# Altium footprint library Package_QFP.PcbLib: 84 footprints (part 4 of 6)
Each footprint in its own frame and in the unit in brackets; x right, y up, seen from the top. Pads: shape width x height; smd on the part's side, far side on the other; paste and mask are expansions set on the pad; w line width, h text height; cw(c..) or ccw(c..) is an arc to the next point about the centre after c.
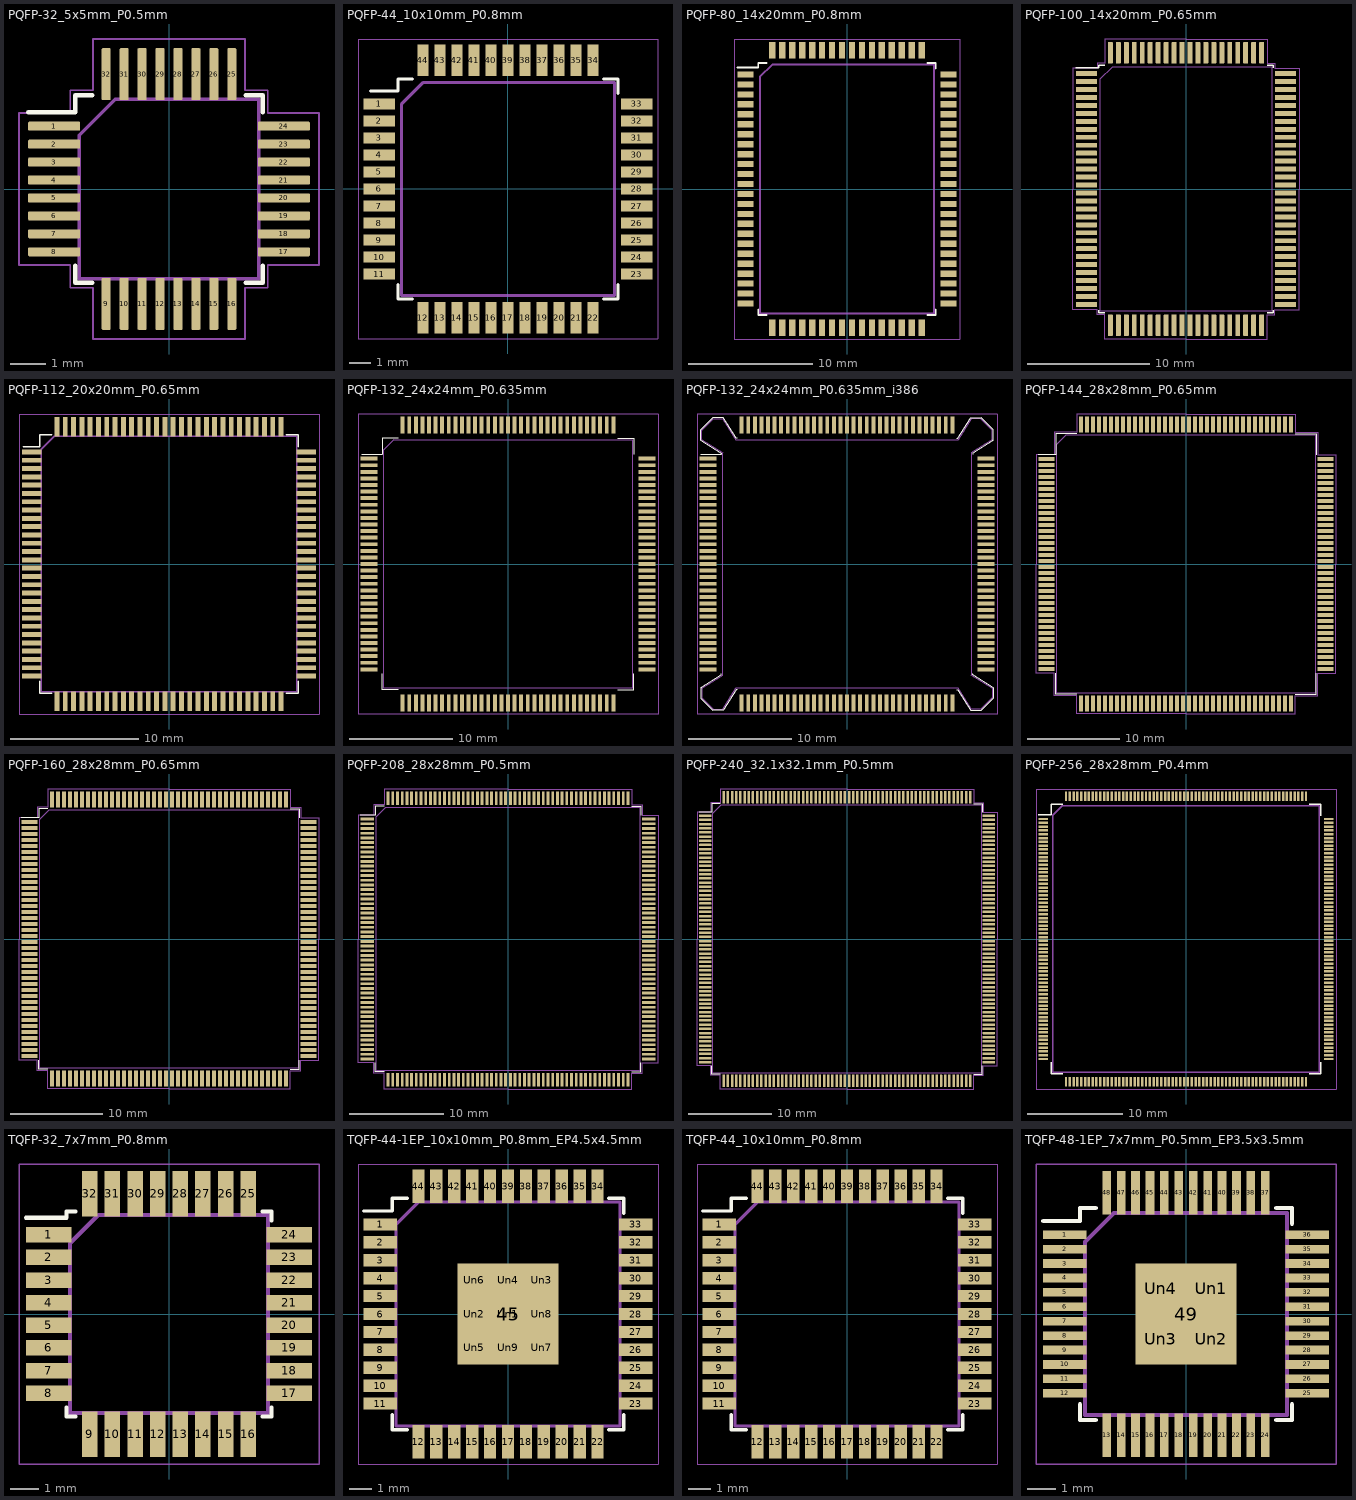
[diagram p3: the footprints below, top view; thin cyan lines are the x and y axes]

## PQFP-32_5x5mm_P0.5mm [mm]
pads (32):
  rrect25% 1.45x0.25 smd: 1(-3.2,1.75) 2(-3.2,1.25) 3(-3.2,0.75) 4(-3.2,0.25) 5(-3.2,-0.25) 6(-3.2,-0.75) 7(-3.2,-1.25) 8(-3.2,-1.75) 17(3.2,-1.75) 18(3.2,-1.25) 19(3.2,-0.75) 20(3.2,-0.25) 21(3.2,0.25) 22(3.2,0.75) 23(3.2,1.25) 24(3.2,1.75)
  rrect25% 0.25x1.45 smd: 9(-1.75,-3.2) 10(-1.25,-3.2) 11(-0.75,-3.2) 12(-0.25,-3.2) 13(0.25,-3.2) 14(0.75,-3.2) 15(1.25,-3.2) 16(1.75,-3.2) 25(1.75,3.2) 26(1.25,3.2) 27(0.75,3.2) 28(0.25,3.2) 29(-0.25,3.2) 30(-0.75,3.2) 31(-1.25,3.2) 32(-1.75,3.2)
F.SilkS:
  lines w0.12: -3.925,2.135 -2.61,2.135 -2.61,2.61 -2.135,2.61 ; -2.61,-2.135 -2.61,-2.61 -2.135,-2.61 ; 2.135,-2.61 2.61,-2.61 2.61,-2.135 ; 2.135,2.61 2.61,2.61 2.61,2.135
F.CrtYd:
  lines w0.05: -4.18,-2.12 -4.18,0 -4.18,2.12 -2.75,2.12 -2.75,2.75 -2.12,2.75 -2.12,4.18 0,4.18 2.12,4.18 2.12,2.75 2.75,2.75 2.75,2.12 4.18,2.12 4.18,0 4.18,-2.12 2.75,-2.12 2.75,-2.75 2.12,-2.75 2.12,-4.18 0,-4.18 -2.12,-4.18 -2.12,-2.75 -2.75,-2.75 -2.75,-2.12 -4.18,-2.12
F.Fab:
  lines w0.1: -2.5,-2.5 -2.5,1.5 -1.5,2.5 2.5,2.5 2.5,-2.5 -2.5,-2.5
  text "'.Designator'" at -4.047,-0.84 h1

## PQFP-44_10x10mm_P0.8mm [mm]
pads (44):
  rect 1.5x0.52 smd: 1(-6.05,4) 2(-6.05,3.2) 3(-6.05,2.4) 4(-6.05,1.6) 5(-6.05,0.8) 6(-6.05,0) 7(-6.05,-0.8) 8(-6.05,-1.6) 9(-6.05,-2.4) 10(-6.05,-3.2) 11(-6.05,-4) 23(6.05,-4) 24(6.05,-3.2) 25(6.05,-2.4) 26(6.05,-1.6) 27(6.05,-0.8) 28(6.05,0) 29(6.05,0.8) 30(6.05,1.6) 31(6.05,2.4) 32(6.05,3.2) 33(6.05,4)
  rect 0.52x1.5 smd: 12(-4,-6.05) 13(-3.2,-6.05) 14(-2.4,-6.05) 15(-1.6,-6.05) 16(-0.8,-6.05) 17(0,-6.05) 18(0.8,-6.05) 19(1.6,-6.05) 20(2.4,-6.05) 21(3.2,-6.05) 22(4,-6.05) 34(4,6.05) 35(3.2,6.05) 36(2.4,6.05) 37(1.6,6.05) 38(0.8,6.05) 39(0,6.05) 40(-0.8,6.05) 41(-1.6,6.05) 42(-2.4,6.05) 43(-3.2,6.05) 44(-4,6.05)
F.SilkS:
  lines w0.15: -6.45,4.6 -5.175,4.6 -5.175,5.175 -4.5,5.175 ; -5.175,-4.5 -5.175,-5.175 -4.5,-5.175 ; 4.5,-5.175 5.175,-5.175 5.175,-4.5 ; 4.5,5.175 5.175,5.175 5.175,4.5
F.CrtYd:
  lines w0.05: -7.05,-7.05 7.05,-7.05 7.05,7.05 -7.05,7.05 -7.05,-7.05
F.Fab:
  lines w0.15: -5,-5 5,-5 5,5 -4,5 -5,4 -5,-5
  text "'.Designator'" at -4.047,-0.84 h1

## PQFP-80_14x20mm_P0.8mm [mm]
pads (80):
  rect 1.3x0.5 smd: 1(-8.15,9.2) 2(-8.15,8.4) 3(-8.15,7.6) 4(-8.15,6.8) 5(-8.15,6) 6(-8.15,5.2) 7(-8.15,4.4) 8(-8.15,3.6) 9(-8.15,2.8) 10(-8.15,2) 11(-8.15,1.2) 12(-8.15,0.4) 13(-8.15,-0.4) 14(-8.15,-1.2) 15(-8.15,-2) 16(-8.15,-2.8) 17(-8.15,-3.6) 18(-8.15,-4.4) 19(-8.15,-5.2) 20(-8.15,-6) 21(-8.15,-6.8) 22(-8.15,-7.6) 23(-8.15,-8.4) 24(-8.15,-9.2) 41(8.15,-9.2) 42(8.15,-8.4) 43(8.15,-7.6) 44(8.15,-6.8) 45(8.15,-6) 46(8.15,-5.2) 47(8.15,-4.4) 48(8.15,-3.6) 49(8.15,-2.8) 50(8.15,-2) 51(8.15,-1.2) 52(8.15,-0.4) 53(8.15,0.4) 54(8.15,1.2) 55(8.15,2) 56(8.15,2.8) 57(8.15,3.6) 58(8.15,4.4) 59(8.15,5.2) 60(8.15,6) 61(8.15,6.8) 62(8.15,7.6) 63(8.15,8.4) 64(8.15,9.2)
  rect 0.5x1.3 smd: 25(-6,-11.15) 26(-5.2,-11.15) 27(-4.4,-11.15) 28(-3.6,-11.15) 29(-2.8,-11.15) 30(-2,-11.15) 31(-1.2,-11.15) 32(-0.4,-11.15) 33(0.4,-11.15) 34(1.2,-11.15) 35(2,-11.15) 36(2.8,-11.15) 37(3.6,-11.15) 38(4.4,-11.15) 39(5.2,-11.15) 40(6,-11.15) 65(6,11.15) 66(5.2,11.15) 67(4.4,11.15) 68(3.6,11.15) 69(2.8,11.15) 70(2,11.15) 71(1.2,11.15) 72(0.4,11.15) 73(-0.4,11.15) 74(-1.2,11.15) 75(-2,11.15) 76(-2.8,11.15) 77(-3.6,11.15) 78(-4.4,11.15) 79(-5.2,11.15) 80(-6,11.15)
F.SilkS:
  lines w0.15: -8.8,9.775 -7.125,9.775 -7.125,10.125 -6.475,10.125 ; -7.125,-9.675 -7.125,-10.125 -6.475,-10.125 ; 6.475,-10.125 7.125,-10.125 7.125,-9.675 ; 6.475,10.125 7.125,10.125 7.125,9.675
F.CrtYd:
  lines w0.05: -9.05,-12.05 -9.05,12.05 9.05,12.05 9.05,-12.05 -9.05,-12.05
F.Fab:
  lines w0.15: -7,-10 7,-10 7,10 -6,10 -7,9 -7,-10
  text "'.Designator'" at -4.047,-0.84 h1

## PQFP-100_14x20mm_P0.65mm [mm]
pads (100):
  rrect25% 1.75x0.4 smd: 1(-8.125,9.425) 2(-8.125,8.775) 3(-8.125,8.125) 4(-8.125,7.475) 5(-8.125,6.825) 6(-8.125,6.175) 7(-8.125,5.525) 8(-8.125,4.875) 9(-8.125,4.225) 10(-8.125,3.575) 11(-8.125,2.925) 12(-8.125,2.275) 13(-8.125,1.625) 14(-8.125,0.975) 15(-8.125,0.325) 16(-8.125,-0.325) 17(-8.125,-0.975) 18(-8.125,-1.625) 19(-8.125,-2.275) 20(-8.125,-2.925) 21(-8.125,-3.575) 22(-8.125,-4.225) 23(-8.125,-4.875) 24(-8.125,-5.525) 25(-8.125,-6.175) 26(-8.125,-6.825) 27(-8.125,-7.475) 28(-8.125,-8.125) 29(-8.125,-8.775) 30(-8.125,-9.425) 51(8.125,-9.425) 52(8.125,-8.775) 53(8.125,-8.125) 54(8.125,-7.475) 55(8.125,-6.825) 56(8.125,-6.175) 57(8.125,-5.525) 58(8.125,-4.875) 59(8.125,-4.225) 60(8.125,-3.575) 61(8.125,-2.925) 62(8.125,-2.275) 63(8.125,-1.625) 64(8.125,-0.975) 65(8.125,-0.325) 66(8.125,0.325) 67(8.125,0.975) 68(8.125,1.625) 69(8.125,2.275) 70(8.125,2.925) 71(8.125,3.575) 72(8.125,4.225) 73(8.125,4.875) 74(8.125,5.525) 75(8.125,6.175) 76(8.125,6.825) 77(8.125,7.475) 78(8.125,8.125) 79(8.125,8.775) 80(8.125,9.425)
  rrect25% 0.4x1.75 smd: 31(-6.175,-11.125) 32(-5.525,-11.125) 33(-4.875,-11.125) 34(-4.225,-11.125) 35(-3.575,-11.125) 36(-2.925,-11.125) 37(-2.275,-11.125) 38(-1.625,-11.125) 39(-0.975,-11.125) 40(-0.325,-11.125) 41(0.325,-11.125) 42(0.975,-11.125) 43(1.625,-11.125) 44(2.275,-11.125) 45(2.925,-11.125) 46(3.575,-11.125) 47(4.225,-11.125) 48(4.875,-11.125) 49(5.525,-11.125) 50(6.175,-11.125) 81(6.175,11.125) 82(5.525,11.125) 83(4.875,11.125) 84(4.225,11.125) 85(3.575,11.125) 86(2.925,11.125) 87(2.275,11.125) 88(1.625,11.125) 89(0.975,11.125) 90(0.325,11.125) 91(-0.325,11.125) 92(-0.975,11.125) 93(-1.625,11.125) 94(-2.275,11.125) 95(-2.925,11.125) 96(-3.575,11.125) 97(-4.225,11.125) 98(-4.875,11.125) 99(-5.525,11.125) 100(-6.175,11.125)
F.SilkS:
  lines w0.12: -9,9.885 -7.11,9.885 -7.11,10.11 -6.635,10.11 ; -7.11,-9.885 -7.11,-10.11 -6.635,-10.11 ; 6.635,-10.11 7.11,-10.11 7.11,-9.885 ; 6.635,10.11 7.11,10.11 7.11,9.885
F.CrtYd:
  lines w0.05: -9.25,-9.88 -7.25,-9.88 -7.25,-10.25 -6.62,-10.25 -6.62,-12.25 0,-12.25 6.62,-12.25 6.62,-10.25 7.25,-10.25 7.25,-9.88 9.25,-9.88 9.25,0 9.25,9.88 7.25,9.88 7.25,10.25 6.62,10.25 6.62,12.25 0,12.25 -6.62,12.25 -6.62,10.25 -7.25,10.25 -7.25,9.88 -9.25,9.88 -9.25,0 -9.25,-9.88
F.Fab:
  lines w0.1: -7,-10 7,-10 7,10 -6,10 -7,9 -7,-10
  text "'.Designator'" at -4.047,-0.84 h1

## PQFP-112_20x20mm_P0.65mm [mm]
pads (112):
  rect 1.5x0.38 smd: 1(-10.75,8.775) 2(-10.75,8.125) 3(-10.75,7.475) 4(-10.75,6.825) 5(-10.75,6.175) 6(-10.75,5.525) 7(-10.75,4.875) 8(-10.75,4.225) 9(-10.75,3.575) 10(-10.75,2.925) 11(-10.75,2.275) 12(-10.75,1.625) 13(-10.75,0.975) 14(-10.75,0.325) 15(-10.75,-0.325) 16(-10.75,-0.975) 17(-10.75,-1.625) 18(-10.75,-2.275) 19(-10.75,-2.925) 20(-10.75,-3.575) 21(-10.75,-4.225) 22(-10.75,-4.875) 23(-10.75,-5.525) 24(-10.75,-6.175) 25(-10.75,-6.825) 26(-10.75,-7.475) 27(-10.75,-8.125) 28(-10.75,-8.775) 57(10.75,-8.775) 58(10.75,-8.125) 59(10.75,-7.475) 60(10.75,-6.825) 61(10.75,-6.175) 62(10.75,-5.525) 63(10.75,-4.875) 64(10.75,-4.225) 65(10.75,-3.575) 66(10.75,-2.925) 67(10.75,-2.275) 68(10.75,-1.625) 69(10.75,-0.975) 70(10.75,-0.325) 71(10.75,0.325) 72(10.75,0.975) 73(10.75,1.625) 74(10.75,2.275) 75(10.75,2.925) 76(10.75,3.575) 77(10.75,4.225) 78(10.75,4.875) 79(10.75,5.525) 80(10.75,6.175) 81(10.75,6.825) 82(10.75,7.475) 83(10.75,8.125) 84(10.75,8.775)
  rect 0.38x1.5 smd: 29(-8.775,-10.75) 30(-8.125,-10.75) 31(-7.475,-10.75) 32(-6.825,-10.75) 33(-6.175,-10.75) 34(-5.525,-10.75) 35(-4.875,-10.75) 36(-4.225,-10.75) 37(-3.575,-10.75) 38(-2.925,-10.75) 39(-2.275,-10.75) 40(-1.625,-10.75) 41(-0.975,-10.75) 42(-0.325,-10.75) 43(0.325,-10.75) 44(0.975,-10.75) 45(1.625,-10.75) 46(2.275,-10.75) 47(2.925,-10.75) 48(3.575,-10.75) 49(4.225,-10.75) 50(4.875,-10.75) 51(5.525,-10.75) 52(6.175,-10.75) 53(6.825,-10.75) 54(7.475,-10.75) 55(8.125,-10.75) 56(8.775,-10.75) 85(8.775,10.75) 86(8.125,10.75) 87(7.475,10.75) 88(6.825,10.75) 89(6.175,10.75) 90(5.525,10.75) 91(4.875,10.75) 92(4.225,10.75) 93(3.575,10.75) 94(2.925,10.75) 95(2.275,10.75) 96(1.625,10.75) 97(0.975,10.75) 98(0.325,10.75) 99(-0.325,10.75) 100(-0.975,10.75) 101(-1.625,10.75) 102(-2.275,10.75) 103(-2.925,10.75) 104(-3.575,10.75) 105(-4.225,10.75) 106(-4.875,10.75) 107(-5.525,10.75) 108(-6.175,10.75) 109(-6.825,10.75) 110(-7.475,10.75) 111(-8.125,10.75) 112(-8.775,10.75)
F.SilkS:
  lines w0.12: -11.4,9.2 -10.12,9.2 -10.12,10.12 -9.2,10.12 ; -10.12,-9.2 -10.12,-10.12 -9.2,-10.12 ; 9.2,-10.12 10.12,-10.12 10.12,-9.2 ; 9.2,10.12 10.12,10.12 10.12,9.2
F.CrtYd:
  lines w0.05: -11.75,-11.75 -11.75,11.75 11.75,11.75 11.75,-11.75 -11.75,-11.75
F.Fab:
  lines w0.1: -10,-10 -10,9 -9,10 10,10 10,-10 -10,-10
  text "'.Designator'" at -4.047,-0.84 h1

## PQFP-132_24x24mm_P0.635mm [mm]
pads (132):
  rect 1.635x0.38 smd: 1(-13.4,10.16) 2(-13.4,9.525) 3(-13.4,8.89) 4(-13.4,8.255) 5(-13.4,7.62) 6(-13.4,6.985) 7(-13.4,6.35) 8(-13.4,5.715) 9(-13.4,5.08) 10(-13.4,4.445) 11(-13.4,3.81) 12(-13.4,3.175) 13(-13.4,2.54) 14(-13.4,1.905) 15(-13.4,1.27) 16(-13.4,0.635) 17(-13.4,0) 18(-13.4,-0.635) 19(-13.4,-1.27) 20(-13.4,-1.905) 21(-13.4,-2.54) 22(-13.4,-3.175) 23(-13.4,-3.81) 24(-13.4,-4.445) 25(-13.4,-5.08) 26(-13.4,-5.715) 27(-13.4,-6.35) 28(-13.4,-6.985) 29(-13.4,-7.62) 30(-13.4,-8.255) 31(-13.4,-8.89) 32(-13.4,-9.525) 33(-13.4,-10.16) 67(13.4,-10.16) 68(13.4,-9.525) 69(13.4,-8.89) 70(13.4,-8.255) 71(13.4,-7.62) 72(13.4,-6.985) 73(13.4,-6.35) 74(13.4,-5.715) 75(13.4,-5.08) 76(13.4,-4.445) 77(13.4,-3.81) 78(13.4,-3.175) 79(13.4,-2.54) 80(13.4,-1.905) 81(13.4,-1.27) 82(13.4,-0.635) 83(13.4,0) 84(13.4,0.635) 85(13.4,1.27) 86(13.4,1.905) 87(13.4,2.54) 88(13.4,3.175) 89(13.4,3.81) 90(13.4,4.445) 91(13.4,5.08) 92(13.4,5.715) 93(13.4,6.35) 94(13.4,6.985) 95(13.4,7.62) 96(13.4,8.255) 97(13.4,8.89) 98(13.4,9.525) 99(13.4,10.16)
  rect 0.38x1.635 smd: 34(-10.16,-13.4) 35(-9.525,-13.4) 36(-8.89,-13.4) 37(-8.255,-13.4) 38(-7.62,-13.4) 39(-6.985,-13.4) 40(-6.35,-13.4) 41(-5.715,-13.4) 42(-5.08,-13.4) 43(-4.445,-13.4) 44(-3.81,-13.4) 45(-3.175,-13.4) 46(-2.54,-13.4) 47(-1.905,-13.4) 48(-1.27,-13.4) 49(-0.635,-13.4) 50(0,-13.4) 51(0.635,-13.4) 52(1.27,-13.4) 53(1.905,-13.4) 54(2.54,-13.4) 55(3.175,-13.4) 56(3.81,-13.4) 57(4.445,-13.4) 58(5.08,-13.4) 59(5.715,-13.4) 60(6.35,-13.4) 61(6.985,-13.4) 62(7.62,-13.4) 63(8.255,-13.4) 64(8.89,-13.4) 65(9.525,-13.4) 66(10.16,-13.4) 100(10.16,13.4) 101(9.525,13.4) 102(8.89,13.4) 103(8.255,13.4) 104(7.62,13.4) 105(6.985,13.4) 106(6.35,13.4) 107(5.715,13.4) 108(5.08,13.4) 109(4.445,13.4) 110(3.81,13.4) 111(3.175,13.4) 112(2.54,13.4) 113(1.905,13.4) 114(1.27,13.4) 115(0.635,13.4) 116(0,13.4) 117(-0.635,13.4) 118(-1.27,13.4) 119(-1.905,13.4) 120(-2.54,13.4) 121(-3.175,13.4) 122(-3.81,13.4) 123(-4.445,13.4) 124(-5.08,13.4) 125(-5.715,13.4) 126(-6.35,13.4) 127(-6.985,13.4) 128(-7.62,13.4) 129(-8.255,13.4) 130(-8.89,13.4) 131(-9.525,13.4) 132(-10.16,13.4)
F.SilkS:
  lines w0.12: -14.1,10.6 -12.12,10.6 -12.12,12.12 -10.6,12.12 ; -12.12,-10.6 -12.12,-12.12 -10.6,-12.12 ; 10.6,-12.12 12.12,-12.12 12.12,-10.6 ; 10.6,12.12 12.12,12.12 12.12,10.6
F.CrtYd:
  lines w0.05: -14.47,-14.47 -14.47,14.47 14.47,14.47 14.47,-14.47 -14.47,-14.47
F.Fab:
  lines w0.1: -12,-12 -12,11 -11,12 12,12 12,-12 -12,-12
  text "'.Designator'" at -4.047,-0.84 h1

## PQFP-132_24x24mm_P0.635mm_i386 [mm]
pads (132):
  rect 1.635x0.38 smd: 1(-13.4,10.16) 2(-13.4,9.525) 3(-13.4,8.89) 4(-13.4,8.255) 5(-13.4,7.62) 6(-13.4,6.985) 7(-13.4,6.35) 8(-13.4,5.715) 9(-13.4,5.08) 10(-13.4,4.445) 11(-13.4,3.81) 12(-13.4,3.175) 13(-13.4,2.54) 14(-13.4,1.905) 15(-13.4,1.27) 16(-13.4,0.635) 17(-13.4,0) 18(-13.4,-0.635) 19(-13.4,-1.27) 20(-13.4,-1.905) 21(-13.4,-2.54) 22(-13.4,-3.175) 23(-13.4,-3.81) 24(-13.4,-4.445) 25(-13.4,-5.08) 26(-13.4,-5.715) 27(-13.4,-6.35) 28(-13.4,-6.985) 29(-13.4,-7.62) 30(-13.4,-8.255) 31(-13.4,-8.89) 32(-13.4,-9.525) 33(-13.4,-10.16) 67(13.4,-10.16) 68(13.4,-9.525) 69(13.4,-8.89) 70(13.4,-8.255) 71(13.4,-7.62) 72(13.4,-6.985) 73(13.4,-6.35) 74(13.4,-5.715) 75(13.4,-5.08) 76(13.4,-4.445) 77(13.4,-3.81) 78(13.4,-3.175) 79(13.4,-2.54) 80(13.4,-1.905) 81(13.4,-1.27) 82(13.4,-0.635) 83(13.4,0) 84(13.4,0.635) 85(13.4,1.27) 86(13.4,1.905) 87(13.4,2.54) 88(13.4,3.175) 89(13.4,3.81) 90(13.4,4.445) 91(13.4,5.08) 92(13.4,5.715) 93(13.4,6.35) 94(13.4,6.985) 95(13.4,7.62) 96(13.4,8.255) 97(13.4,8.89) 98(13.4,9.525) 99(13.4,10.16)
  rect 0.38x1.635 smd: 34(-10.16,-13.4) 35(-9.525,-13.4) 36(-8.89,-13.4) 37(-8.255,-13.4) 38(-7.62,-13.4) 39(-6.985,-13.4) 40(-6.35,-13.4) 41(-5.715,-13.4) 42(-5.08,-13.4) 43(-4.445,-13.4) 44(-3.81,-13.4) 45(-3.175,-13.4) 46(-2.54,-13.4) 47(-1.905,-13.4) 48(-1.27,-13.4) 49(-0.635,-13.4) 50(0,-13.4) 51(0.635,-13.4) 52(1.27,-13.4) 53(1.905,-13.4) 54(2.54,-13.4) 55(3.175,-13.4) 56(3.81,-13.4) 57(4.445,-13.4) 58(5.08,-13.4) 59(5.715,-13.4) 60(6.35,-13.4) 61(6.985,-13.4) 62(7.62,-13.4) 63(8.255,-13.4) 64(8.89,-13.4) 65(9.525,-13.4) 66(10.16,-13.4) 100(10.16,13.4) 101(9.525,13.4) 102(8.89,13.4) 103(8.255,13.4) 104(7.62,13.4) 105(6.985,13.4) 106(6.35,13.4) 107(5.715,13.4) 108(5.08,13.4) 109(4.445,13.4) 110(3.81,13.4) 111(3.175,13.4) 112(2.54,13.4) 113(1.905,13.4) 114(1.27,13.4) 115(0.635,13.4) 116(0,13.4) 117(-0.635,13.4) 118(-1.27,13.4) 119(-1.905,13.4) 120(-2.54,13.4) 121(-3.175,13.4) 122(-3.81,13.4) 123(-4.445,13.4) 124(-5.08,13.4) 125(-5.715,13.4) 126(-6.35,13.4) 127(-6.985,13.4) 128(-7.62,13.4) 129(-8.255,13.4) 130(-8.89,13.4) 131(-9.525,13.4) 132(-10.16,13.4)
F.SilkS:
  lines w0.12: -14.1,10.6 -12.12,10.6 -12.12,10.67 -14.12,11.94 -14.12,12.96 -12.96,14.12 -11.94,14.12 -10.67,12.12 -10.6,12.12 ; -12.12,-10.6 -12.12,-10.67 -14.12,-11.94 -14.12,-12.96 -12.96,-14.12 -11.94,-14.12 -10.67,-12.12 -10.6,-12.12 ; 10.6,-12.12 10.67,-12.12 11.94,-14.12 12.96,-14.12 14.12,-12.96 14.12,-11.94 12.12,-10.67 12.12,-10.6 ; 10.6,12.12 10.67,12.12 11.94,14.12 12.96,14.12 14.12,12.96 14.12,11.94 12.12,10.67 12.12,10.6
F.CrtYd:
  lines w0.05: -14.47,-14.47 14.47,-14.47 14.47,14.47 -14.47,14.47 -14.47,-14.47
F.Fab:
  lines w0.1: -14,-12.9 -14,-12 -12,-10.73 -12,10.73 -14,12 -14,12.9 -12.9,14 -12,14 -10.73,12 10.73,12 12,14 12.9,14 14,12.9 14,12 12,10.73 12,-10.73 14,-12 14,-12.9 12.9,-14 12,-14 10.73,-12 -10.73,-12 -12,-14 -12.9,-14 -14,-12.9
  text "'.Designator'" at -4.047,-0.84 h1

## PQFP-144_28x28mm_P0.65mm [mm]
pads (144):
  rrect25% 1.75x0.4 smd: 1(-15.125,11.375) 2(-15.125,10.725) 3(-15.125,10.075) 4(-15.125,9.425) 5(-15.125,8.775) 6(-15.125,8.125) 7(-15.125,7.475) 8(-15.125,6.825) 9(-15.125,6.175) 10(-15.125,5.525) 11(-15.125,4.875) 12(-15.125,4.225) 13(-15.125,3.575) 14(-15.125,2.925) 15(-15.125,2.275) 16(-15.125,1.625) 17(-15.125,0.975) 18(-15.125,0.325) 19(-15.125,-0.325) 20(-15.125,-0.975) 21(-15.125,-1.625) 22(-15.125,-2.275) 23(-15.125,-2.925) 24(-15.125,-3.575) 25(-15.125,-4.225) 26(-15.125,-4.875) 27(-15.125,-5.525) 28(-15.125,-6.175) 29(-15.125,-6.825) 30(-15.125,-7.475) 31(-15.125,-8.125) 32(-15.125,-8.775) 33(-15.125,-9.425) 34(-15.125,-10.075) 35(-15.125,-10.725) 36(-15.125,-11.375) 73(15.125,-11.375) 74(15.125,-10.725) 75(15.125,-10.075) 76(15.125,-9.425) 77(15.125,-8.775) 78(15.125,-8.125) 79(15.125,-7.475) 80(15.125,-6.825) 81(15.125,-6.175) 82(15.125,-5.525) 83(15.125,-4.875) 84(15.125,-4.225) 85(15.125,-3.575) 86(15.125,-2.925) 87(15.125,-2.275) 88(15.125,-1.625) 89(15.125,-0.975) 90(15.125,-0.325) 91(15.125,0.325) 92(15.125,0.975) 93(15.125,1.625) 94(15.125,2.275) 95(15.125,2.925) 96(15.125,3.575) 97(15.125,4.225) 98(15.125,4.875) 99(15.125,5.525) 100(15.125,6.175) 101(15.125,6.825) 102(15.125,7.475) 103(15.125,8.125) 104(15.125,8.775) 105(15.125,9.425) 106(15.125,10.075) 107(15.125,10.725) 108(15.125,11.375)
  rrect25% 0.4x1.75 smd: 37(-11.375,-15.125) 38(-10.725,-15.125) 39(-10.075,-15.125) 40(-9.425,-15.125) 41(-8.775,-15.125) 42(-8.125,-15.125) 43(-7.475,-15.125) 44(-6.825,-15.125) 45(-6.175,-15.125) 46(-5.525,-15.125) 47(-4.875,-15.125) 48(-4.225,-15.125) 49(-3.575,-15.125) 50(-2.925,-15.125) 51(-2.275,-15.125) 52(-1.625,-15.125) 53(-0.975,-15.125) 54(-0.325,-15.125) 55(0.325,-15.125) 56(0.975,-15.125) 57(1.625,-15.125) 58(2.275,-15.125) 59(2.925,-15.125) 60(3.575,-15.125) 61(4.225,-15.125) 62(4.875,-15.125) 63(5.525,-15.125) 64(6.175,-15.125) 65(6.825,-15.125) 66(7.475,-15.125) 67(8.125,-15.125) 68(8.775,-15.125) 69(9.425,-15.125) 70(10.075,-15.125) 71(10.725,-15.125) 72(11.375,-15.125) 109(11.375,15.125) 110(10.725,15.125) 111(10.075,15.125) 112(9.425,15.125) 113(8.775,15.125) 114(8.125,15.125) 115(7.475,15.125) 116(6.825,15.125) 117(6.175,15.125) 118(5.525,15.125) 119(4.875,15.125) 120(4.225,15.125) 121(3.575,15.125) 122(2.925,15.125) 123(2.275,15.125) 124(1.625,15.125) 125(0.975,15.125) 126(0.325,15.125) 127(-0.325,15.125) 128(-0.975,15.125) 129(-1.625,15.125) 130(-2.275,15.125) 131(-2.925,15.125) 132(-3.575,15.125) 133(-4.225,15.125) 134(-4.875,15.125) 135(-5.525,15.125) 136(-6.175,15.125) 137(-6.825,15.125) 138(-7.475,15.125) 139(-8.125,15.125) 140(-8.775,15.125) 141(-9.425,15.125) 142(-10.075,15.125) 143(-10.725,15.125) 144(-11.375,15.125)
F.SilkS:
  lines w0.12: -16,11.835 -14.11,11.835 -14.11,14.11 -11.835,14.11 ; -14.11,-11.835 -14.11,-14.11 -11.835,-14.11 ; 11.835,-14.11 14.11,-14.11 14.11,-11.835 ; 11.835,14.11 14.11,14.11 14.11,11.835
F.CrtYd:
  lines w0.05: -16.25,-11.82 -14.25,-11.82 -14.25,-14.25 -11.82,-14.25 -11.82,-16.25 0,-16.25 11.82,-16.25 11.82,-14.25 14.25,-14.25 14.25,-11.82 16.25,-11.82 16.25,0 16.25,11.82 14.25,11.82 14.25,14.25 11.82,14.25 11.82,16.25 0,16.25 -11.82,16.25 -11.82,14.25 -14.25,14.25 -14.25,11.82 -16.25,11.82 -16.25,0 -16.25,-11.82
F.Fab:
  lines w0.1: -14,-14 14,-14 14,14 -13,14 -14,13 -14,-14
  text "'.Designator'" at -4.047,-0.84 h1

## PQFP-160_28x28mm_P0.65mm [mm]
pads (160):
  rrect25% 1.75x0.4 smd: 1(-15.125,12.675) 2(-15.125,12.025) 3(-15.125,11.375) 4(-15.125,10.725) 5(-15.125,10.075) 6(-15.125,9.425) 7(-15.125,8.775) 8(-15.125,8.125) 9(-15.125,7.475) 10(-15.125,6.825) 11(-15.125,6.175) 12(-15.125,5.525) 13(-15.125,4.875) 14(-15.125,4.225) 15(-15.125,3.575) 16(-15.125,2.925) 17(-15.125,2.275) 18(-15.125,1.625) 19(-15.125,0.975) 20(-15.125,0.325) 21(-15.125,-0.325) 22(-15.125,-0.975) 23(-15.125,-1.625) 24(-15.125,-2.275) 25(-15.125,-2.925) 26(-15.125,-3.575) 27(-15.125,-4.225) 28(-15.125,-4.875) 29(-15.125,-5.525) 30(-15.125,-6.175) 31(-15.125,-6.825) 32(-15.125,-7.475) 33(-15.125,-8.125) 34(-15.125,-8.775) 35(-15.125,-9.425) 36(-15.125,-10.075) 37(-15.125,-10.725) 38(-15.125,-11.375) 39(-15.125,-12.025) 40(-15.125,-12.675) 81(15.125,-12.675) 82(15.125,-12.025) 83(15.125,-11.375) 84(15.125,-10.725) 85(15.125,-10.075) 86(15.125,-9.425) 87(15.125,-8.775) 88(15.125,-8.125) 89(15.125,-7.475) 90(15.125,-6.825) 91(15.125,-6.175) 92(15.125,-5.525) 93(15.125,-4.875) 94(15.125,-4.225) 95(15.125,-3.575) 96(15.125,-2.925) 97(15.125,-2.275) 98(15.125,-1.625) 99(15.125,-0.975) 100(15.125,-0.325) 101(15.125,0.325) 102(15.125,0.975) 103(15.125,1.625) 104(15.125,2.275) 105(15.125,2.925) 106(15.125,3.575) 107(15.125,4.225) 108(15.125,4.875) 109(15.125,5.525) 110(15.125,6.175) 111(15.125,6.825) 112(15.125,7.475) 113(15.125,8.125) 114(15.125,8.775) 115(15.125,9.425) 116(15.125,10.075) 117(15.125,10.725) 118(15.125,11.375) 119(15.125,12.025) 120(15.125,12.675)
  rrect25% 0.4x1.75 smd: 41(-12.675,-15.125) 42(-12.025,-15.125) 43(-11.375,-15.125) 44(-10.725,-15.125) 45(-10.075,-15.125) 46(-9.425,-15.125) 47(-8.775,-15.125) 48(-8.125,-15.125) 49(-7.475,-15.125) 50(-6.825,-15.125) 51(-6.175,-15.125) 52(-5.525,-15.125) 53(-4.875,-15.125) 54(-4.225,-15.125) 55(-3.575,-15.125) 56(-2.925,-15.125) 57(-2.275,-15.125) 58(-1.625,-15.125) 59(-0.975,-15.125) 60(-0.325,-15.125) 61(0.325,-15.125) 62(0.975,-15.125) 63(1.625,-15.125) 64(2.275,-15.125) 65(2.925,-15.125) 66(3.575,-15.125) 67(4.225,-15.125) 68(4.875,-15.125) 69(5.525,-15.125) 70(6.175,-15.125) 71(6.825,-15.125) 72(7.475,-15.125) 73(8.125,-15.125) 74(8.775,-15.125) 75(9.425,-15.125) 76(10.075,-15.125) 77(10.725,-15.125) 78(11.375,-15.125) 79(12.025,-15.125) 80(12.675,-15.125) 121(12.675,15.125) 122(12.025,15.125) 123(11.375,15.125) 124(10.725,15.125) 125(10.075,15.125) 126(9.425,15.125) 127(8.775,15.125) 128(8.125,15.125) 129(7.475,15.125) 130(6.825,15.125) 131(6.175,15.125) 132(5.525,15.125) 133(4.875,15.125) 134(4.225,15.125) 135(3.575,15.125) 136(2.925,15.125) 137(2.275,15.125) 138(1.625,15.125) 139(0.975,15.125) 140(0.325,15.125) 141(-0.325,15.125) 142(-0.975,15.125) 143(-1.625,15.125) 144(-2.275,15.125) 145(-2.925,15.125) 146(-3.575,15.125) 147(-4.225,15.125) 148(-4.875,15.125) 149(-5.525,15.125) 150(-6.175,15.125) 151(-6.825,15.125) 152(-7.475,15.125) 153(-8.125,15.125) 154(-8.775,15.125) 155(-9.425,15.125) 156(-10.075,15.125) 157(-10.725,15.125) 158(-11.375,15.125) 159(-12.025,15.125) 160(-12.675,15.125)
F.SilkS:
  lines w0.12: -16,13.135 -14.11,13.135 -14.11,14.11 -13.135,14.11 ; -14.11,-13.135 -14.11,-14.11 -13.135,-14.11 ; 13.135,-14.11 14.11,-14.11 14.11,-13.135 ; 13.135,14.11 14.11,14.11 14.11,13.135
F.CrtYd:
  lines w0.05: -16.25,-13.12 -14.25,-13.12 -14.25,-14.25 -13.12,-14.25 -13.12,-16.25 0,-16.25 13.12,-16.25 13.12,-14.25 14.25,-14.25 14.25,-13.12 16.25,-13.12 16.25,0 16.25,13.12 14.25,13.12 14.25,14.25 13.12,14.25 13.12,16.25 0,16.25 -13.12,16.25 -13.12,14.25 -14.25,14.25 -14.25,13.12 -16.25,13.12 -16.25,0 -16.25,-13.12
F.Fab:
  lines w0.1: -14,-14 14,-14 14,14 -13,14 -14,13 -14,-14
  text "'.Designator'" at -4.047,-0.84 h1

## PQFP-208_28x28mm_P0.5mm [mm]
pads (208):
  rrect25% 1.475x0.3 smd: 1(-14.962,12.75) 2(-14.962,12.25) 3(-14.962,11.75) 4(-14.962,11.25) 5(-14.962,10.75) 6(-14.962,10.25) 7(-14.962,9.75) 8(-14.962,9.25) 9(-14.962,8.75) 10(-14.962,8.25) 11(-14.962,7.75) 12(-14.962,7.25) 13(-14.962,6.75) 14(-14.962,6.25) 15(-14.962,5.75) 16(-14.962,5.25) 17(-14.962,4.75) 18(-14.962,4.25) 19(-14.962,3.75) 20(-14.962,3.25) 21(-14.962,2.75) 22(-14.962,2.25) 23(-14.962,1.75) 24(-14.962,1.25) 25(-14.962,0.75) 26(-14.962,0.25) 27(-14.962,-0.25) 28(-14.962,-0.75) 29(-14.962,-1.25) 30(-14.962,-1.75) 31(-14.962,-2.25) 32(-14.962,-2.75) 33(-14.962,-3.25) 34(-14.962,-3.75) 35(-14.962,-4.25) 36(-14.962,-4.75) 37(-14.962,-5.25) 38(-14.962,-5.75) 39(-14.962,-6.25) 40(-14.962,-6.75) 41(-14.962,-7.25) 42(-14.962,-7.75) 43(-14.962,-8.25) 44(-14.962,-8.75) 45(-14.962,-9.25) 46(-14.962,-9.75) 47(-14.962,-10.25) 48(-14.962,-10.75) 49(-14.962,-11.25) 50(-14.962,-11.75) 51(-14.962,-12.25) 52(-14.962,-12.75) 105(14.962,-12.75) 106(14.962,-12.25) 107(14.962,-11.75) 108(14.962,-11.25) 109(14.962,-10.75) 110(14.962,-10.25) 111(14.962,-9.75) 112(14.962,-9.25) 113(14.962,-8.75) 114(14.962,-8.25) 115(14.962,-7.75) 116(14.962,-7.25) 117(14.962,-6.75) 118(14.962,-6.25) 119(14.962,-5.75) 120(14.962,-5.25) 121(14.962,-4.75) 122(14.962,-4.25) 123(14.962,-3.75) 124(14.962,-3.25) 125(14.962,-2.75) 126(14.962,-2.25) 127(14.962,-1.75) 128(14.962,-1.25) 129(14.962,-0.75) 130(14.962,-0.25) 131(14.962,0.25) 132(14.962,0.75) 133(14.962,1.25) 134(14.962,1.75) 135(14.962,2.25) 136(14.962,2.75) 137(14.962,3.25) 138(14.962,3.75) 139(14.962,4.25) 140(14.962,4.75) 141(14.962,5.25) 142(14.962,5.75) 143(14.962,6.25) 144(14.962,6.75) 145(14.962,7.25) 146(14.962,7.75) 147(14.962,8.25) 148(14.962,8.75) 149(14.962,9.25) 150(14.962,9.75) 151(14.962,10.25) 152(14.962,10.75) 153(14.962,11.25) 154(14.962,11.75) 155(14.962,12.25) 156(14.962,12.75)
  rrect25% 0.3x1.475 smd: 53(-12.75,-14.962) 54(-12.25,-14.962) 55(-11.75,-14.962) 56(-11.25,-14.962) 57(-10.75,-14.962) 58(-10.25,-14.962) 59(-9.75,-14.962) 60(-9.25,-14.962) 61(-8.75,-14.962) 62(-8.25,-14.962) 63(-7.75,-14.962) 64(-7.25,-14.962) 65(-6.75,-14.962) 66(-6.25,-14.962) 67(-5.75,-14.962) 68(-5.25,-14.962) 69(-4.75,-14.962) 70(-4.25,-14.962) 71(-3.75,-14.962) 72(-3.25,-14.962) 73(-2.75,-14.962) 74(-2.25,-14.962) 75(-1.75,-14.962) 76(-1.25,-14.962) 77(-0.75,-14.962) 78(-0.25,-14.962) 79(0.25,-14.962) 80(0.75,-14.962) 81(1.25,-14.962) 82(1.75,-14.962) 83(2.25,-14.962) 84(2.75,-14.962) 85(3.25,-14.962) 86(3.75,-14.962) 87(4.25,-14.962) 88(4.75,-14.962) 89(5.25,-14.962) 90(5.75,-14.962) 91(6.25,-14.962) 92(6.75,-14.962) 93(7.25,-14.962) 94(7.75,-14.962) 95(8.25,-14.962) 96(8.75,-14.962) 97(9.25,-14.962) 98(9.75,-14.962) 99(10.25,-14.962) 100(10.75,-14.962) 101(11.25,-14.962) 102(11.75,-14.962) 103(12.25,-14.962) 104(12.75,-14.962) 157(12.75,14.962) 158(12.25,14.962) 159(11.75,14.962) 160(11.25,14.962) 161(10.75,14.962) 162(10.25,14.962) 163(9.75,14.962) 164(9.25,14.962) 165(8.75,14.962) 166(8.25,14.962) 167(7.75,14.962) 168(7.25,14.962) 169(6.75,14.962) 170(6.25,14.962) 171(5.75,14.962) 172(5.25,14.962) 173(4.75,14.962) 174(4.25,14.962) 175(3.75,14.962) 176(3.25,14.962) 177(2.75,14.962) 178(2.25,14.962) 179(1.75,14.962) 180(1.25,14.962) 181(0.75,14.962) 182(0.25,14.962) 183(-0.25,14.962) 184(-0.75,14.962) 185(-1.25,14.962) 186(-1.75,14.962) 187(-2.25,14.962) 188(-2.75,14.962) 189(-3.25,14.962) 190(-3.75,14.962) 191(-4.25,14.962) 192(-4.75,14.962) 193(-5.25,14.962) 194(-5.75,14.962) 195(-6.25,14.962) 196(-6.75,14.962) 197(-7.25,14.962) 198(-7.75,14.962) 199(-8.25,14.962) 200(-8.75,14.962) 201(-9.25,14.962) 202(-9.75,14.962) 203(-10.25,14.962) 204(-10.75,14.962) 205(-11.25,14.962) 206(-11.75,14.962) 207(-12.25,14.962) 208(-12.75,14.962)
F.SilkS:
  lines w0.12: -15.7,13.16 -14.11,13.16 -14.11,14.11 -13.16,14.11 ; -14.11,-13.16 -14.11,-14.11 -13.16,-14.11 ; 13.16,-14.11 14.11,-14.11 14.11,-13.16 ; 13.16,14.11 14.11,14.11 14.11,13.16
F.CrtYd:
  lines w0.05: -15.95,-13.15 -14.25,-13.15 -14.25,-14.25 -13.15,-14.25 -13.15,-15.95 0,-15.95 13.15,-15.95 13.15,-14.25 14.25,-14.25 14.25,-13.15 15.95,-13.15 15.95,0 15.95,13.15 14.25,13.15 14.25,14.25 13.15,14.25 13.15,15.95 0,15.95 -13.15,15.95 -13.15,14.25 -14.25,14.25 -14.25,13.15 -15.95,13.15 -15.95,0 -15.95,-13.15
F.Fab:
  lines w0.1: -14,-14 14,-14 14,14 -13,14 -14,13 -14,-14
  text "'.Designator'" at -4.047,-0.84 h1

## PQFP-240_32.1x32.1mm_P0.5mm [mm]
pads (240):
  rrect25% 1.475x0.3 smd: 1(-16.963,14.75) 2(-16.963,14.25) 3(-16.963,13.75) 4(-16.963,13.25) 5(-16.963,12.75) 6(-16.963,12.25) 7(-16.963,11.75) 8(-16.963,11.25) 9(-16.963,10.75) 10(-16.963,10.25) 11(-16.963,9.75) 12(-16.963,9.25) 13(-16.963,8.75) 14(-16.963,8.25) 15(-16.963,7.75) 16(-16.963,7.25) 17(-16.963,6.75) 18(-16.963,6.25) 19(-16.963,5.75) 20(-16.963,5.25) 21(-16.963,4.75) 22(-16.963,4.25) 23(-16.963,3.75) 24(-16.963,3.25) 25(-16.963,2.75) 26(-16.963,2.25) 27(-16.963,1.75) 28(-16.963,1.25) 29(-16.963,0.75) 30(-16.963,0.25) 31(-16.963,-0.25) 32(-16.963,-0.75) 33(-16.963,-1.25) 34(-16.963,-1.75) 35(-16.963,-2.25) 36(-16.963,-2.75) 37(-16.963,-3.25) 38(-16.963,-3.75) 39(-16.963,-4.25) 40(-16.963,-4.75) 41(-16.963,-5.25) 42(-16.963,-5.75) 43(-16.963,-6.25) 44(-16.963,-6.75) 45(-16.963,-7.25) 46(-16.963,-7.75) 47(-16.963,-8.25) 48(-16.963,-8.75) 49(-16.963,-9.25) 50(-16.963,-9.75) 51(-16.963,-10.25) 52(-16.963,-10.75) 53(-16.963,-11.25) 54(-16.963,-11.75) 55(-16.963,-12.25) 56(-16.963,-12.75) 57(-16.963,-13.25) 58(-16.963,-13.75) 59(-16.963,-14.25) 60(-16.963,-14.75) 121(16.963,-14.75) 122(16.963,-14.25) 123(16.963,-13.75) 124(16.963,-13.25) 125(16.963,-12.75) 126(16.963,-12.25) 127(16.963,-11.75) 128(16.963,-11.25) 129(16.963,-10.75) 130(16.963,-10.25) 131(16.963,-9.75) 132(16.963,-9.25) 133(16.963,-8.75) 134(16.963,-8.25) 135(16.963,-7.75) 136(16.963,-7.25) 137(16.963,-6.75) 138(16.963,-6.25) 139(16.963,-5.75) 140(16.963,-5.25) 141(16.963,-4.75) 142(16.963,-4.25) 143(16.963,-3.75) 144(16.963,-3.25) 145(16.963,-2.75) 146(16.963,-2.25) 147(16.963,-1.75) 148(16.963,-1.25) 149(16.963,-0.75) 150(16.963,-0.25) 151(16.963,0.25) 152(16.963,0.75) 153(16.963,1.25) 154(16.963,1.75) 155(16.963,2.25) 156(16.963,2.75) 157(16.963,3.25) 158(16.963,3.75) 159(16.963,4.25) 160(16.963,4.75) 161(16.963,5.25) 162(16.963,5.75) 163(16.963,6.25) 164(16.963,6.75) 165(16.963,7.25) 166(16.963,7.75) 167(16.963,8.25) 168(16.963,8.75) 169(16.963,9.25) 170(16.963,9.75) 171(16.963,10.25) 172(16.963,10.75) 173(16.963,11.25) 174(16.963,11.75) 175(16.963,12.25) 176(16.963,12.75) 177(16.963,13.25) 178(16.963,13.75) 179(16.963,14.25) 180(16.963,14.75)
  rrect25% 0.3x1.475 smd: 61(-14.75,-16.963) 62(-14.25,-16.963) 63(-13.75,-16.963) 64(-13.25,-16.963) 65(-12.75,-16.963) 66(-12.25,-16.963) 67(-11.75,-16.963) 68(-11.25,-16.963) 69(-10.75,-16.963) 70(-10.25,-16.963) 71(-9.75,-16.963) 72(-9.25,-16.963) 73(-8.75,-16.963) 74(-8.25,-16.963) 75(-7.75,-16.963) 76(-7.25,-16.963) 77(-6.75,-16.963) 78(-6.25,-16.963) 79(-5.75,-16.963) 80(-5.25,-16.963) 81(-4.75,-16.963) 82(-4.25,-16.963) 83(-3.75,-16.963) 84(-3.25,-16.963) 85(-2.75,-16.963) 86(-2.25,-16.963) 87(-1.75,-16.963) 88(-1.25,-16.963) 89(-0.75,-16.963) 90(-0.25,-16.963) 91(0.25,-16.963) 92(0.75,-16.963) 93(1.25,-16.963) 94(1.75,-16.963) 95(2.25,-16.963) 96(2.75,-16.963) 97(3.25,-16.963) 98(3.75,-16.963) 99(4.25,-16.963) 100(4.75,-16.963) 101(5.25,-16.963) 102(5.75,-16.963) 103(6.25,-16.963) 104(6.75,-16.963) 105(7.25,-16.963) 106(7.75,-16.963) 107(8.25,-16.963) 108(8.75,-16.963) 109(9.25,-16.963) 110(9.75,-16.963) 111(10.25,-16.963) 112(10.75,-16.963) 113(11.25,-16.963) 114(11.75,-16.963) 115(12.25,-16.963) 116(12.75,-16.963) 117(13.25,-16.963) 118(13.75,-16.963) 119(14.25,-16.963) 120(14.75,-16.963) 181(14.75,16.963) 182(14.25,16.963) 183(13.75,16.963) 184(13.25,16.963) 185(12.75,16.963) 186(12.25,16.963) 187(11.75,16.963) 188(11.25,16.963) 189(10.75,16.963) 190(10.25,16.963) 191(9.75,16.963) 192(9.25,16.963) 193(8.75,16.963) 194(8.25,16.963) 195(7.75,16.963) 196(7.25,16.963) 197(6.75,16.963) 198(6.25,16.963) 199(5.75,16.963) 200(5.25,16.963) 201(4.75,16.963) 202(4.25,16.963) 203(3.75,16.963) 204(3.25,16.963) 205(2.75,16.963) 206(2.25,16.963) 207(1.75,16.963) 208(1.25,16.963) 209(0.75,16.963) 210(0.25,16.963) 211(-0.25,16.963) 212(-0.75,16.963) 213(-1.25,16.963) 214(-1.75,16.963) 215(-2.25,16.963) 216(-2.75,16.963) 217(-3.25,16.963) 218(-3.75,16.963) 219(-4.25,16.963) 220(-4.75,16.963) 221(-5.25,16.963) 222(-5.75,16.963) 223(-6.25,16.963) 224(-6.75,16.963) 225(-7.25,16.963) 226(-7.75,16.963) 227(-8.25,16.963) 228(-8.75,16.963) 229(-9.25,16.963) 230(-9.75,16.963) 231(-10.25,16.963) 232(-10.75,16.963) 233(-11.25,16.963) 234(-11.75,16.963) 235(-12.25,16.963) 236(-12.75,16.963) 237(-13.25,16.963) 238(-13.75,16.963) 239(-14.25,16.963) 240(-14.75,16.963)
F.SilkS:
  lines w0.12: -17.7,15.16 -16.16,15.16 -16.16,16.16 -15.16,16.16 ; -16.16,-15.16 -16.16,-16.16 -15.16,-16.16 ; 15.16,-16.16 16.16,-16.16 16.16,-15.16 ; 15.16,16.16 16.16,16.16 16.16,15.16
F.CrtYd:
  lines w0.05: -17.95,-15.15 -16.3,-15.15 -16.3,-16.3 -15.15,-16.3 -15.15,-17.95 0,-17.95 15.15,-17.95 15.15,-16.3 16.3,-16.3 16.3,-15.15 17.95,-15.15 17.95,0 17.95,15.15 16.3,15.15 16.3,16.3 15.15,16.3 15.15,17.95 0,17.95 -15.15,17.95 -15.15,16.3 -16.3,16.3 -16.3,15.15 -17.95,15.15 -17.95,0 -17.95,-15.15
F.Fab:
  lines w0.1: -16.05,-16.05 -16.05,15.05 -15.05,16.05 16.05,16.05 16.05,-16.05 -16.05,-16.05
  text "'.Designator'" at -4.047,-0.84 h1

## PQFP-256_28x28mm_P0.4mm [mm]
pads (256):
  rect 1x0.26 smd: 1(-15,12.6) 2(-15,12.2) 3(-15,11.8) 4(-15,11.4) 5(-15,11) 6(-15,10.6) 7(-15,10.2) 8(-15,9.8) 9(-15,9.4) 10(-15,9) 11(-15,8.6) 12(-15,8.2) 13(-15,7.8) 14(-15,7.4) 15(-15,7) 16(-15,6.6) 17(-15,6.2) 18(-15,5.8) 19(-15,5.4) 20(-15,5) 21(-15,4.6) 22(-15,4.2) 23(-15,3.8) 24(-15,3.4) 25(-15,3) 26(-15,2.6) 27(-15,2.2) 28(-15,1.8) 29(-15,1.4) 30(-15,1) 31(-15,0.6) 32(-15,0.2) 33(-15,-0.2) 34(-15,-0.6) 35(-15,-1) 36(-15,-1.4) 37(-15,-1.8) 38(-15,-2.2) 39(-15,-2.6) 40(-15,-3) 41(-15,-3.4) 42(-15,-3.8) 43(-15,-4.2) 44(-15,-4.6) 45(-15,-5) 46(-15,-5.4) 47(-15,-5.8) 48(-15,-6.2) 49(-15,-6.6) 50(-15,-7) 51(-15,-7.4) 52(-15,-7.8) 53(-15,-8.2) 54(-15,-8.6) 55(-15,-9) 56(-15,-9.4) 57(-15,-9.8) 58(-15,-10.2) 59(-15,-10.6) 60(-15,-11) 61(-15,-11.4) 62(-15,-11.8) 63(-15,-12.2) 64(-15,-12.6) 129(15,-12.6) 130(15,-12.2) 131(15,-11.8) 132(15,-11.4) 133(15,-11) 134(15,-10.6) 135(15,-10.2) 136(15,-9.8) 137(15,-9.4) 138(15,-9) 139(15,-8.6) 140(15,-8.2) 141(15,-7.8) 142(15,-7.4) 143(15,-7) 144(15,-6.6) 145(15,-6.2) 146(15,-5.8) 147(15,-5.4) 148(15,-5) 149(15,-4.6) 150(15,-4.2) 151(15,-3.8) 152(15,-3.4) 153(15,-3) 154(15,-2.6) 155(15,-2.2) 156(15,-1.8) 157(15,-1.4) 158(15,-1) 159(15,-0.6) 160(15,-0.2) 161(15,0.2) 162(15,0.6) 163(15,1) 164(15,1.4) 165(15,1.8) 166(15,2.2) 167(15,2.6) 168(15,3) 169(15,3.4) 170(15,3.8) 171(15,4.2) 172(15,4.6) 173(15,5) 174(15,5.4) 175(15,5.8) 176(15,6.2) 177(15,6.6) 178(15,7) 179(15,7.4) 180(15,7.8) 181(15,8.2) 182(15,8.6) 183(15,9) 184(15,9.4) 185(15,9.8) 186(15,10.2) 187(15,10.6) 188(15,11) 189(15,11.4) 190(15,11.8) 191(15,12.2) 192(15,12.6)
  rect 0.26x1 smd: 65(-12.6,-15) 66(-12.2,-15) 67(-11.8,-15) 68(-11.4,-15) 69(-11,-15) 70(-10.6,-15) 71(-10.2,-15) 72(-9.8,-15) 73(-9.4,-15) 74(-9,-15) 75(-8.6,-15) 76(-8.2,-15) 77(-7.8,-15) 78(-7.4,-15) 79(-7,-15) 80(-6.6,-15) 81(-6.2,-15) 82(-5.8,-15) 83(-5.4,-15) 84(-5,-15) 85(-4.6,-15) 86(-4.2,-15) 87(-3.8,-15) 88(-3.4,-15) 89(-3,-15) 90(-2.6,-15) 91(-2.2,-15) 92(-1.8,-15) 93(-1.4,-15) 94(-1,-15) 95(-0.6,-15) 96(-0.2,-15) 97(0.2,-15) 98(0.6,-15) 99(1,-15) 100(1.4,-15) 101(1.8,-15) 102(2.2,-15) 103(2.6,-15) 104(3,-15) 105(3.4,-15) 106(3.8,-15) 107(4.2,-15) 108(4.6,-15) 109(5,-15) 110(5.4,-15) 111(5.8,-15) 112(6.2,-15) 113(6.6,-15) 114(7,-15) 115(7.4,-15) 116(7.8,-15) 117(8.2,-15) 118(8.6,-15) 119(9,-15) 120(9.4,-15) 121(9.8,-15) 122(10.2,-15) 123(10.6,-15) 124(11,-15) 125(11.4,-15) 126(11.8,-15) 127(12.2,-15) 128(12.6,-15) 193(12.6,15) 194(12.2,15) 195(11.8,15) 196(11.4,15) 197(11,15) 198(10.6,15) 199(10.2,15) 200(9.8,15) 201(9.4,15) 202(9,15) 203(8.6,15) 204(8.2,15) 205(7.8,15) 206(7.4,15) 207(7,15) 208(6.6,15) 209(6.2,15) 210(5.8,15) 211(5.4,15) 212(5,15) 213(4.6,15) 214(4.2,15) 215(3.8,15) 216(3.4,15) 217(3,15) 218(2.6,15) 219(2.2,15) 220(1.8,15) 221(1.4,15) 222(1,15) 223(0.6,15) 224(0.2,15) 225(-0.2,15) 226(-0.6,15) 227(-1,15) 228(-1.4,15) 229(-1.8,15) 230(-2.2,15) 231(-2.6,15) 232(-3,15) 233(-3.4,15) 234(-3.8,15) 235(-4.2,15) 236(-4.6,15) 237(-5,15) 238(-5.4,15) 239(-5.8,15) 240(-6.2,15) 241(-6.6,15) 242(-7,15) 243(-7.4,15) 244(-7.8,15) 245(-8.2,15) 246(-8.6,15) 247(-9,15) 248(-9.4,15) 249(-9.8,15) 250(-10.2,15) 251(-10.6,15) 252(-11,15) 253(-11.4,15) 254(-11.8,15) 255(-12.2,15) 256(-12.6,15)
F.SilkS:
  lines w0.15: -15.5,13.05 -14.125,13.05 -14.125,14.125 -12.955,14.125 ; -14.125,-12.955 -14.125,-14.125 -12.955,-14.125 ; 12.955,-14.125 14.125,-14.125 14.125,-12.955 ; 12.955,14.125 14.125,14.125 14.125,12.955
F.CrtYd:
  lines w0.05: -15.75,-15.75 15.75,-15.75 15.75,15.75 -15.75,15.75 -15.75,-15.75
F.Fab:
  lines w0.15: -14,-14 -14,13 -13,14 14,14 14,-14 -14,-14
  text "'.Designator'" at -4.047,-0.84 h1

## TQFP-32_7x7mm_P0.8mm [mm]
pads (32):
  rect 1.6x0.55 smd: 1(-4.25,2.8) 2(-4.25,2) 3(-4.25,1.2) 4(-4.25,0.4) 5(-4.25,-0.4) 6(-4.25,-1.2) 7(-4.25,-2) 8(-4.25,-2.8) 17(4.25,-2.8) 18(4.25,-2) 19(4.25,-1.2) 20(4.25,-0.4) 21(4.25,0.4) 22(4.25,1.2) 23(4.25,2) 24(4.25,2.8)
  rect 0.55x1.6 smd: 9(-2.8,-4.25) 10(-2,-4.25) 11(-1.2,-4.25) 12(-0.4,-4.25) 13(0.4,-4.25) 14(1.2,-4.25) 15(2,-4.25) 16(2.8,-4.25) 25(2.8,4.25) 26(2,4.25) 27(1.2,4.25) 28(0.4,4.25) 29(-0.4,4.25) 30(-1.2,4.25) 31(-2,4.25) 32(-2.8,4.25)
F.SilkS:
  lines w0.15: -5.05,3.4 -3.625,3.4 -3.625,3.625 -3.3,3.625 ; -3.625,-3.3 -3.625,-3.625 -3.3,-3.625 ; 3.3,-3.625 3.625,-3.625 3.625,-3.3 ; 3.3,3.625 3.625,3.625 3.625,3.3
F.CrtYd:
  lines w0.05: -5.3,-5.3 -5.3,5.3 5.3,5.3 5.3,-5.3 -5.3,-5.3
F.Fab:
  lines w0.15: -3.5,-3.5 3.5,-3.5 3.5,3.5 -2.5,3.5 -3.5,2.5 -3.5,-3.5
  text "'.Designator'" at -4.047,-0.84 h1

## TQFP-44-1EP_10x10mm_P0.8mm_EP4.5x4.5mm [mm]
pads (54):
  rect 1.5x0.55 smd: 1(-5.7,4) 2(-5.7,3.2) 3(-5.7,2.4) 4(-5.7,1.6) 5(-5.7,0.8) 6(-5.7,0) 7(-5.7,-0.8) 8(-5.7,-1.6) 9(-5.7,-2.4) 10(-5.7,-3.2) 11(-5.7,-4) 23(5.7,-4) 24(5.7,-3.2) 25(5.7,-2.4) 26(5.7,-1.6) 27(5.7,-0.8) 28(5.7,0) 29(5.7,0.8) 30(5.7,1.6) 31(5.7,2.4) 32(5.7,3.2) 33(5.7,4)
  rect 0.55x1.5 smd: 12(-4,-5.7) 13(-3.2,-5.7) 14(-2.4,-5.7) 15(-1.6,-5.7) 16(-0.8,-5.7) 17(0,-5.7) 18(0.8,-5.7) 19(1.6,-5.7) 20(2.4,-5.7) 21(3.2,-5.7) 22(4,-5.7) 34(4,5.7) 35(3.2,5.7) 36(2.4,5.7) 37(1.6,5.7) 38(0.8,5.7) 39(0,5.7) 40(-0.8,5.7) 41(-1.6,5.7) 42(-2.4,5.7) 43(-3.2,5.7) 44(-4,5.7)
  rect 4.5x4.5 smd: 45(0,0)
  rect 1.16x1.16 on Top Paste: Un1(0,0) Un2(-1.5,0) Un3(1.5,1.5) Un4(0,1.5) Un5(-1.5,-1.5) Un6(-1.5,1.5) Un7(1.5,-1.5) Un8(1.5,0) Un9(0,-1.5)
F.SilkS:
  lines w0.15: -6.45,4.6 -5.175,4.6 -5.175,5.175 -4.5,5.175 ; -5.175,-4.5 -5.175,-5.175 -4.5,-5.175 ; 4.5,-5.175 5.175,-5.175 5.175,-4.5 ; 4.5,5.175 5.175,5.175 5.175,4.5
F.CrtYd:
  lines w0.05: -6.7,-6.7 -6.7,6.7 6.7,6.7 6.7,-6.7 -6.7,-6.7
F.Fab:
  lines w0.15: -5,-5 5,-5 5,5 -4,5 -5,4 -5,-5
  text "'.Designator'" at -4.047,-0.84 h1

## TQFP-44_10x10mm_P0.8mm [mm]
pads (44):
  rect 1.5x0.55 smd: 1(-5.7,4) 2(-5.7,3.2) 3(-5.7,2.4) 4(-5.7,1.6) 5(-5.7,0.8) 6(-5.7,0) 7(-5.7,-0.8) 8(-5.7,-1.6) 9(-5.7,-2.4) 10(-5.7,-3.2) 11(-5.7,-4) 23(5.7,-4) 24(5.7,-3.2) 25(5.7,-2.4) 26(5.7,-1.6) 27(5.7,-0.8) 28(5.7,0) 29(5.7,0.8) 30(5.7,1.6) 31(5.7,2.4) 32(5.7,3.2) 33(5.7,4)
  rect 0.55x1.5 smd: 12(-4,-5.7) 13(-3.2,-5.7) 14(-2.4,-5.7) 15(-1.6,-5.7) 16(-0.8,-5.7) 17(0,-5.7) 18(0.8,-5.7) 19(1.6,-5.7) 20(2.4,-5.7) 21(3.2,-5.7) 22(4,-5.7) 34(4,5.7) 35(3.2,5.7) 36(2.4,5.7) 37(1.6,5.7) 38(0.8,5.7) 39(0,5.7) 40(-0.8,5.7) 41(-1.6,5.7) 42(-2.4,5.7) 43(-3.2,5.7) 44(-4,5.7)
F.SilkS:
  lines w0.15: -6.45,4.6 -5.175,4.6 -5.175,5.175 -4.5,5.175 ; -5.175,-4.5 -5.175,-5.175 -4.5,-5.175 ; 4.5,-5.175 5.175,-5.175 5.175,-4.5 ; 4.5,5.175 5.175,5.175 5.175,4.5
F.CrtYd:
  lines w0.05: -6.7,-6.7 -6.7,6.7 6.7,6.7 6.7,-6.7 -6.7,-6.7
F.Fab:
  lines w0.15: -5,-5 -5,4 -4,5 5,5 5,-5 -5,-5
  text "'.Designator'" at -4.047,-0.84 h1

## TQFP-48-1EP_7x7mm_P0.5mm_EP3.5x3.5mm [mm]
pads (53):
  rect 1.5x0.3 smd: 1(-4.2,2.75) 2(-4.2,2.25) 3(-4.2,1.75) 4(-4.2,1.25) 5(-4.2,0.75) 6(-4.2,0.25) 7(-4.2,-0.25) 8(-4.2,-0.75) 9(-4.2,-1.25) 10(-4.2,-1.75) 11(-4.2,-2.25) 12(-4.2,-2.75) 25(4.2,-2.75) 26(4.2,-2.25) 27(4.2,-1.75) 28(4.2,-1.25) 29(4.2,-0.75) 30(4.2,-0.25) 31(4.2,0.25) 32(4.2,0.75) 33(4.2,1.25) 34(4.2,1.75) 35(4.2,2.25) 36(4.2,2.75)
  rect 0.3x1.5 smd: 13(-2.75,-4.2) 14(-2.25,-4.2) 15(-1.75,-4.2) 16(-1.25,-4.2) 17(-0.75,-4.2) 18(-0.25,-4.2) 19(0.25,-4.2) 20(0.75,-4.2) 21(1.25,-4.2) 22(1.75,-4.2) 23(2.25,-4.2) 24(2.75,-4.2) 37(2.75,4.2) 38(2.25,4.2) 39(1.75,4.2) 40(1.25,4.2) 41(0.75,4.2) 42(0.25,4.2) 43(-0.25,4.2) 44(-0.75,4.2) 45(-1.25,4.2) 46(-1.75,4.2) 47(-2.25,4.2) 48(-2.75,4.2)
  rect 3.5x3.5 smd: 49(0,0)
  rect 1.35x1.35 on Top Paste: Un1(0.875,0.875) Un2(0.875,-0.875) Un3(-0.875,-0.875) Un4(-0.875,0.875)
F.SilkS:
  lines w0.15: -4.95,3.225 -3.675,3.225 -3.675,3.675 -3.125,3.675 ; -3.675,-3.125 -3.675,-3.675 -3.125,-3.675 ; 3.125,-3.675 3.675,-3.675 3.675,-3.125 ; 3.125,3.675 3.675,3.675 3.675,3.125
F.CrtYd:
  lines w0.05: -5.2,-5.2 5.2,-5.2 5.2,5.2 -5.2,5.2 -5.2,-5.2
F.Fab:
  lines w0.15: -3.5,-3.5 -3.5,2.5 -2.5,3.5 3.5,3.5 3.5,-3.5 -3.5,-3.5
  text "'.Designator'" at -4.047,-0.84 h1